# Altium footprint library THU VIEN PCB.PCBLib: 911 footprints (part 40 of 57)
Each footprint in its own frame and in the unit in brackets; x right, y up, seen from the top. Pads: shape width x height; smd on the part's side, far side on the other; paste and mask are expansions set on the pad; w line width, h text height; cw(c..) or ccw(c..) is an arc to the next point about the centre after c.
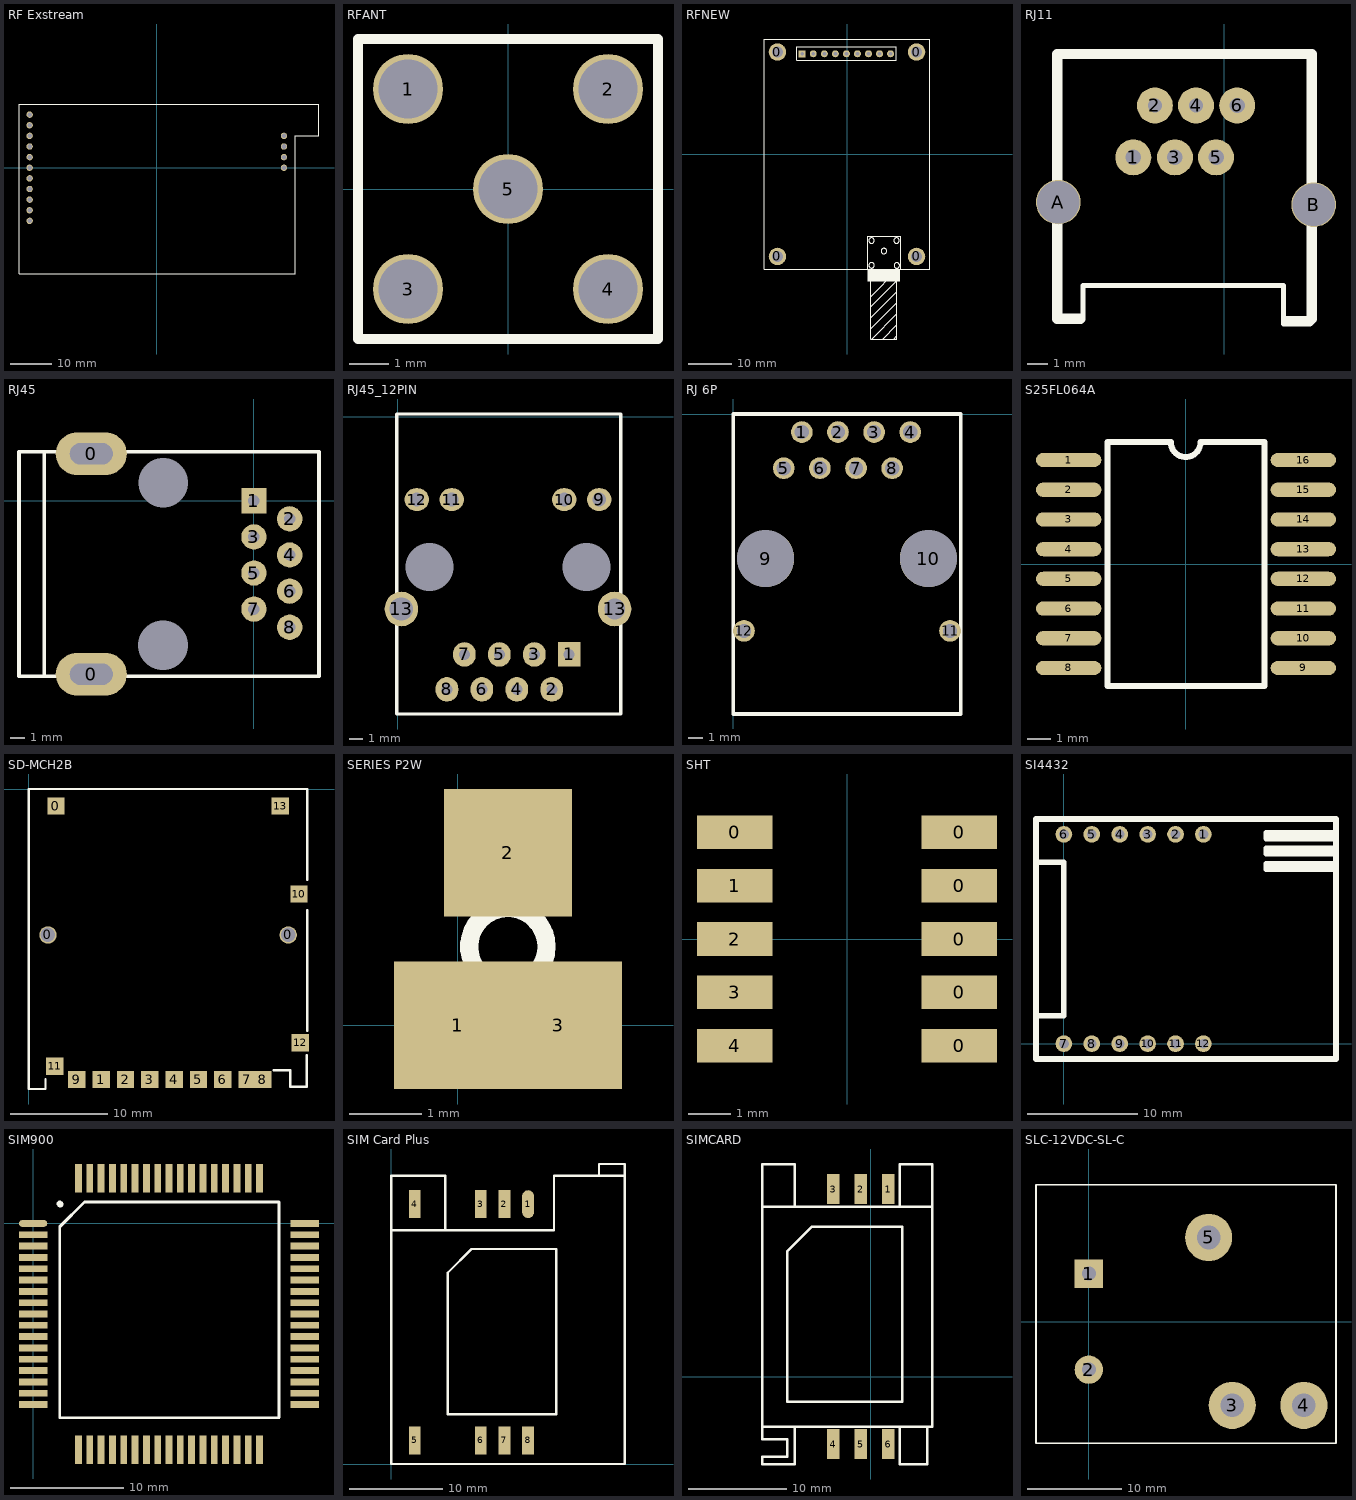
[diagram p39: the footprints below, top view; thin cyan lines are the x and y axes]

## RF Exstream [mil] "Modul RF maxstream 900MHz"
pads (15):
  round 60 hole 43.31: 1(-1197.5,500) 2(-1197.5,400) 3(-1197.5,300) 4(-1197.5,200) 5(-1197.5,100) 6(-1197.5,0) 7(-1197.5,-100) 8(-1197.5,-200) 9(-1197.5,-300) 10(-1197.5,-400) 11(-1197.5,-500) 12(1197.5,300) 13(1197.5,200) 14(1197.5,100) 15(1197.5,0)
Top Overlay:
  lines w10: -1297.5,-1000 -1297.5,600 1527.5,600 1527.5,300 1302.5,300 1302.5,-1000 -1297.5,-1000

## RFANT [mil]
pads (5):
  round 70 hole 59.06 unplated: 1(-100,100) 2(100,100) 3(-100,-100) 4(100,-100) 5(0,0)
Top Overlay:
  lines w10: -150,-150 -150,100 -150,150 150,150 150,-150 -150,-150

## RFNEW [mm] "Module RF"
height 10
pads (13):
  round 4 hole 2.5: 0(-16,-23.5) 0(-16,23.5) 0(16,-23.5) 0(16,23.5)
  rect 1.6x1.6 hole 0.9: 1(-10.3,23.1)
  round 1.6 hole 0.9: 2(-7.76,23.1) 3(-5.22,23.1) 4(-2.68,23.1) 5(-0.14,23.1) 6(2.4,23.1) 7(4.94,23.1) 8(7.48,23.1) 9(10.02,23.1)
Top Overlay:
  circle w0.254: c8.497,-22.275 r0.635
  circle w0.254: c5.652,-19.862 r0.635
  circle w0.254: c11.392,-19.862 r0.635
  circle w0.254: c11.455,-25.586 r0.635
  circle w0.254: c5.652,-25.551 r0.635
  rectangle: 4.724,-29.318 12.192,-26.492
  lines w0.2: 5.5,-40.171 11.5,-34.171 ; 5.5,-37.631 11.5,-31.631 ; 5.5,-29.091 8.04,-26.551 ; 5.506,-35.085 11.5,-29.091 ; 5.582,-32.621 11.5,-26.703 ; 5.785,-42.426 11.5,-36.711 ; 8.251,-42.5 11.5,-39.251 ; 10.791,-42.5 11.5,-41.791 ; -11.57,21.59 11.29,21.59 11.29,24.765 -11.57,24.765 -11.57,21.59
  lines w0.254: 5.5,-26.5 5.5,-42.5 11.5,-42.5 11.5,-26.5 ; -19,-26.5 19,-26.5 19,26.5 -19,26.5 -19,-26.5 ; 4.724,-26.5 4.724,-20.15 4.724,-18.88 12.344,-18.88 12.344,-26.5 4.724,-26.5

## RJ11 [mil]
pads (8):
  round 70 hole 30 unplated: 1(-177,-301) 3(-96,-301)
  round 70 hole 27.56 unplated: 2(-135,-200) 4(-55,-200)
  round 70 hole 30: 5(-16,-301) 6(25,-200)
  round 86.61 hole 82.68 unplated: A(-323,-388) B(174,-393)
Top Overlay:
  lines w10: -275,-610 -275,-550 -255,-550 -225,-550 60,-550 100,-550 105,-550 115,-550 115,-625
  lines w20: -325,-615 -325,-100 170,-100 170,-615 ; -320,-615 -280,-615 ; 120,-620 165,-620
3D body "RJ11.step": height 571.47, standoff -137.2, extent -358.46,-626.22 208.47,-114.41

## RJ45 [mil]
pads (12):
  oval 196.85x118.11 hole 59.06 slot 118.11 at 0 deg: 0(-450,-480) 0(-450,130)
  rect 70x70 hole 31.5 unplated: 1(0,0)
  round 70 hole 31.5 unplated: 2(99,-50) 3(0,-100) 4(99,-150) 5(0,-200) 6(99,-250) 7(0,-300) 8(99,-350)
  round 70 hole 137.8 unplated: ""(-252,-400) ""(-251,50)
Top Overlay:
  lines w10: -580,-480 -580,130 ; -375,135.04 -306,135.04 ; -650,-485.04 -510,-485.04 -408,-485.04 50,-485.04 148,-485.04 180,-485.04 180,135.03 148.37,135.03 50,135.04 -414,135.04 -509,135.04 -650,135.04 -650,-485.04
3D body "RJ45_NO_LED.step": height 527.05, standoff -124.33, extent -675.59,-484.68 153.08,144.69

## RJ45_12PIN [mm]
pads (16):
  rect 1.651x1.778 hole 0.8 unplated: 1(12.45,-17.27)
  oval 1.651x1.778 hole 0.8 unplated: 2(11.18,-19.81) 3(9.91,-17.27) 4(8.64,-19.81) 5(7.37,-17.27) 6(6.1,-19.81) 7(4.83,-17.27) 8(3.56,-19.81)
  oval 1.778x1.651 hole 1: 9(14.625,-6.02) 10(12.085,-6.02) 11(3.915,-6.02) 12(1.375,-6.02)
  oval 2.424x2.525 hole 1.7: 13(0.255,-13.97)
  oval 2.424x2.525 hole 1.5: 13(15.745,-13.97)
  oval 1.651x1.778 hole 3.5 unplated: ""(2.285,-10.92) ""(13.715,-10.92)
Top Overlay:
  lines w0.254: -0.1,-21.6 -0.1,0.2 16.2,0.2 16.2,-21.6 -0.1,-21.6
3D body "User Library-HR911105A.STEP": height 13.51, standoff -2.99, extent 0.1,-21.4 15.98,0

## RJ 6P [mil] "jac ethernet"
height 551.18
pads (12):
  round 60 hole 39.37: 1(190,-50) 2(290,-50) 3(390,-50) 4(490,-50) 5(140,-150) 6(240,-150) 7(340,-150) 8(440,-150) 11(600,-600) 12(30,-600)
  round 157.48 hole 157.48: 9(90,-400) 10(540,-400)
Top Overlay:
  lines w10: 0,-830 630,-830 630,0 0,0 0,-830

## S25FL064A [mil]
pads (16):
  oval 110x24 smd: 1(-197.5,175) 2(-197.5,125) 3(-197.5,75) 4(-197.5,25) 5(-197.5,-25) 6(-197.5,-75) 7(-197.5,-125) 8(-197.5,-175) 9(197.5,-175) 10(197.5,-125) 11(197.5,-75) 12(197.5,-25) 13(197.5,25) 14(197.5,75) 15(197.5,125) 16(197.5,175)
Top Overlay:
  lines w10: -132.5,-205 132.5,-205 132.5,205 24.5,205 cw(c-0.5,205) -25.5,205 -132.5,205 -132.5,-205

## SD-MCH2B [mil]
pads (16):
  round 70 hole 59.05 unplated: 0(76.77,-590.55) 0(1049.21,-590.55)
  rect 70x70 smd: 0(109.25,-68.9) 1(292.32,-1175.55) 2(390.75,-1175.55) 3(489.17,-1175.55) 4(587.6,-1175.55) 5(686.02,-1175.55) 6(784.45,-1175.55) 7(882.87,-1175.55) 8(946.85,-1175.55) 9(193.9,-1175.55) 10(1092.52,-425.2) 11(104.33,-1122.05) 12(1098.43,-1026.38) 13(1016.73,-68.9)
Top Overlay:
  lines w10: 66.93,-1174.07 66.93,-1213.98 0,-1213.98 0,-698.98 0,0 1125.98,0 1125.98,-367.54 ; 990.92,-1138.62 1057.09,-1138.62 1057.09,-1205.55 1124.02,-1205.55 1124.02,-1077.57 ; 1125.98,-978.57 1125.98,-690.55 1125.98,-490.53

## SERIES P2W [mil]
pads (3):
  rect 70x70 smd: 1(0,0) 2(27.56,94.49) 3(55.12,0)
Top Overlay:
  circle w10: c27.46,43 r21.2

## SHT [mm]
pads (10):
  rect 1.8x0.8 smd: 0(-2.667,2.54) 0(2.667,-2.54) 0(2.667,-1.27) 0(2.667,0) 0(2.667,1.27) 0(2.667,2.54) 1(-2.667,1.27) 2(-2.667,0) 3(-2.667,-1.27) 4(-2.667,-2.54)
3D body "User Library-SHT1x.step": height 2.36, standoff 0, extent -2.338,-4.295 2.592,3.175

## SI4432 [mil] "SI4432"
pads (12):
  round 60 hole 35: 1(500,750) 2(400,750) 3(300,750) 4(200,750) 5(100,750) 6(0,750) 7(0,0) 8(100,0) 9(200,0) 10(300,0) 11(400,0) 12(500,0)
Top Overlay:
  lines w20: -100,100 0,100 0,650 -100,650 ; 975,625 725,625 725,645 975,645 ; 975,680 725,680 725,700 975,700 ; 975,735 725,735 725,755 975,755 ; -100,-55 975,-55 975,805 600,805 -100,805 -100,-55

## SIM900 [mm]
pads (68):
  oval 2.5x0.6 smd: 1(0,0)
  rect 2.5x0.6 smd: 2(0,-1) 3(0,-2) 4(0,-3) 5(0,-4) 6(0,-5) 7(0,-6) 8(0,-7) 9(0,-8) 10(0,-9) 11(0,-10) 12(0,-11) 13(0,-12) 14(0,-13) 15(0,-14) 16(0,-15) 17(0,-16) 35(24,-16) 36(24,-15) 37(24,-14) 38(24,-13) 39(24,-12) 40(24,-11) 41(24,-10) 42(24,-9) 43(24,-8) 44(24,-7) 45(24,-6) 46(24,-5) 47(24,-4) 48(24,-3) 49(24,-2) 50(24,-1) 51(24,0)
  rect 0.6x2.5 smd: 18(4,-20) 19(5,-20) 20(6,-20) 21(7,-20) 22(8,-20) 23(9,-20) 24(10,-20) 25(11,-20) 26(12,-20) 27(13,-20) 28(14,-20) 29(15,-20) 30(16,-20) 31(17,-20) 32(18,-20) 33(19,-20) 34(20,-20) 52(20,4) 53(19,4) 54(18,4) 55(17,4) 56(16,4) 57(15,4) 58(14,4) 59(13,4) 60(12,4) 61(11,4) 62(10,4) 63(9,4) 64(8,4) 65(7,4) 66(6,4) 67(5,4) 68(4,4)
Top Overlay:
  lines w0.25: 2.586,-17.16 21.697,-17.16 21.717,-17.14 21.717,1.547 ; 2.675,-17.163 2.357,-17.163 2.347,-17.153 2.347,-0.297 4.526,1.882 21.707,1.882 21.714,1.875 21.714,1.478
  lines w0.55: 2.349,1.73 2.4,1.679 2.413,1.679 2.416,1.679 2.423,1.687
3D body "SIM900.step": height 3.04, standoff 0.02, extent 0,-20 24,4

## SIM Card Plus [mm]
pads (8):
  oval 1.27x3 smd: 1(14.732,27.94)
  rect 1.27x3 smd: 2(12.192,27.94) 3(9.652,27.94) 4(2.54,27.94) 5(2.54,2.54) 6(9.652,2.54) 7(12.192,2.54) 8(14.732,2.54)
Top Overlay:
  lines w0.254: 0,25.146 17.526,25.146 17.526,30.988 22.352,30.988 ; 5.842,25.146 5.842,30.988 0,30.988 0,0 25.146,0 25.146,30.988 ; 22.352,30.988 25.146,30.988 ; 22.352,30.988 22.352,32.258 25.146,32.258 25.146,30.988 ; 6.096,5.334 17.78,5.334 17.78,23.114 8.636,23.114 6.096,20.574 6.096,5.334
3D body "Sim Card Plush.stp": height 3.76, standoff 0.06, extent 0.2,-0.006 25.2,32.194

## SIMCARD [mil] "SOCKET Khe Cam The Sim"
pads (6):
  rect 50x118.11 smd: 1(70,750) 2(-40,750) 3(-150,750) 4(-150,-270) 5(-40,-270) 6(70,-270)
Top Overlay:
  lines w10: -305,-200 -305,-350 -435,-350 -435,-320 -405,-320 -335,-320 -335,-250 -435,-250 -435,-200 ; -305,680 -305,850 -435,850 -435,680 ; 115,-200 115,-350 225,-350 225,-200 ; 115,680 115,850 245,850 245,680 ; -435,-200 -435,680 ; -435,-200 245,-200 245,680 ; -435,680 245,680 ; -335,-100 -335,500 -235,600 125,600 125,-100 -335,-100

## SLC-12VDC-SL-C [mm] "RELAY"
height 28
pads (5):
  rect 3x3 hole 1.5: 1(0,5.08)
  round 3 hole 1.5: 2(0,-5.1)
  round 5 hole 2.5: 3(15.2,-8.89) 4(22.8,-8.89) 5(12.7,8.91)
Top Overlay:
  lines w0.2: 26.15,-12.9 -5.6,-12.9 ; 26.2,-12.9 26.2,14.5 -5.6,14.5 ; -5.6,-12.9 -5.6,14.5 ; -5.6,-12.9 -5.6,14.5